# Altium footprint library Tienanh.PcbLib: 190 footprints (part 12 of 12)
Each footprint in its own frame and in the unit in brackets; x right, y up, seen from the top. Pads: shape width x height; smd on the part's side, far side on the other; paste and mask are expansions set on the pad; w line width, h text height; cw(c..) or ccw(c..) is an arc to the next point about the centre after c.
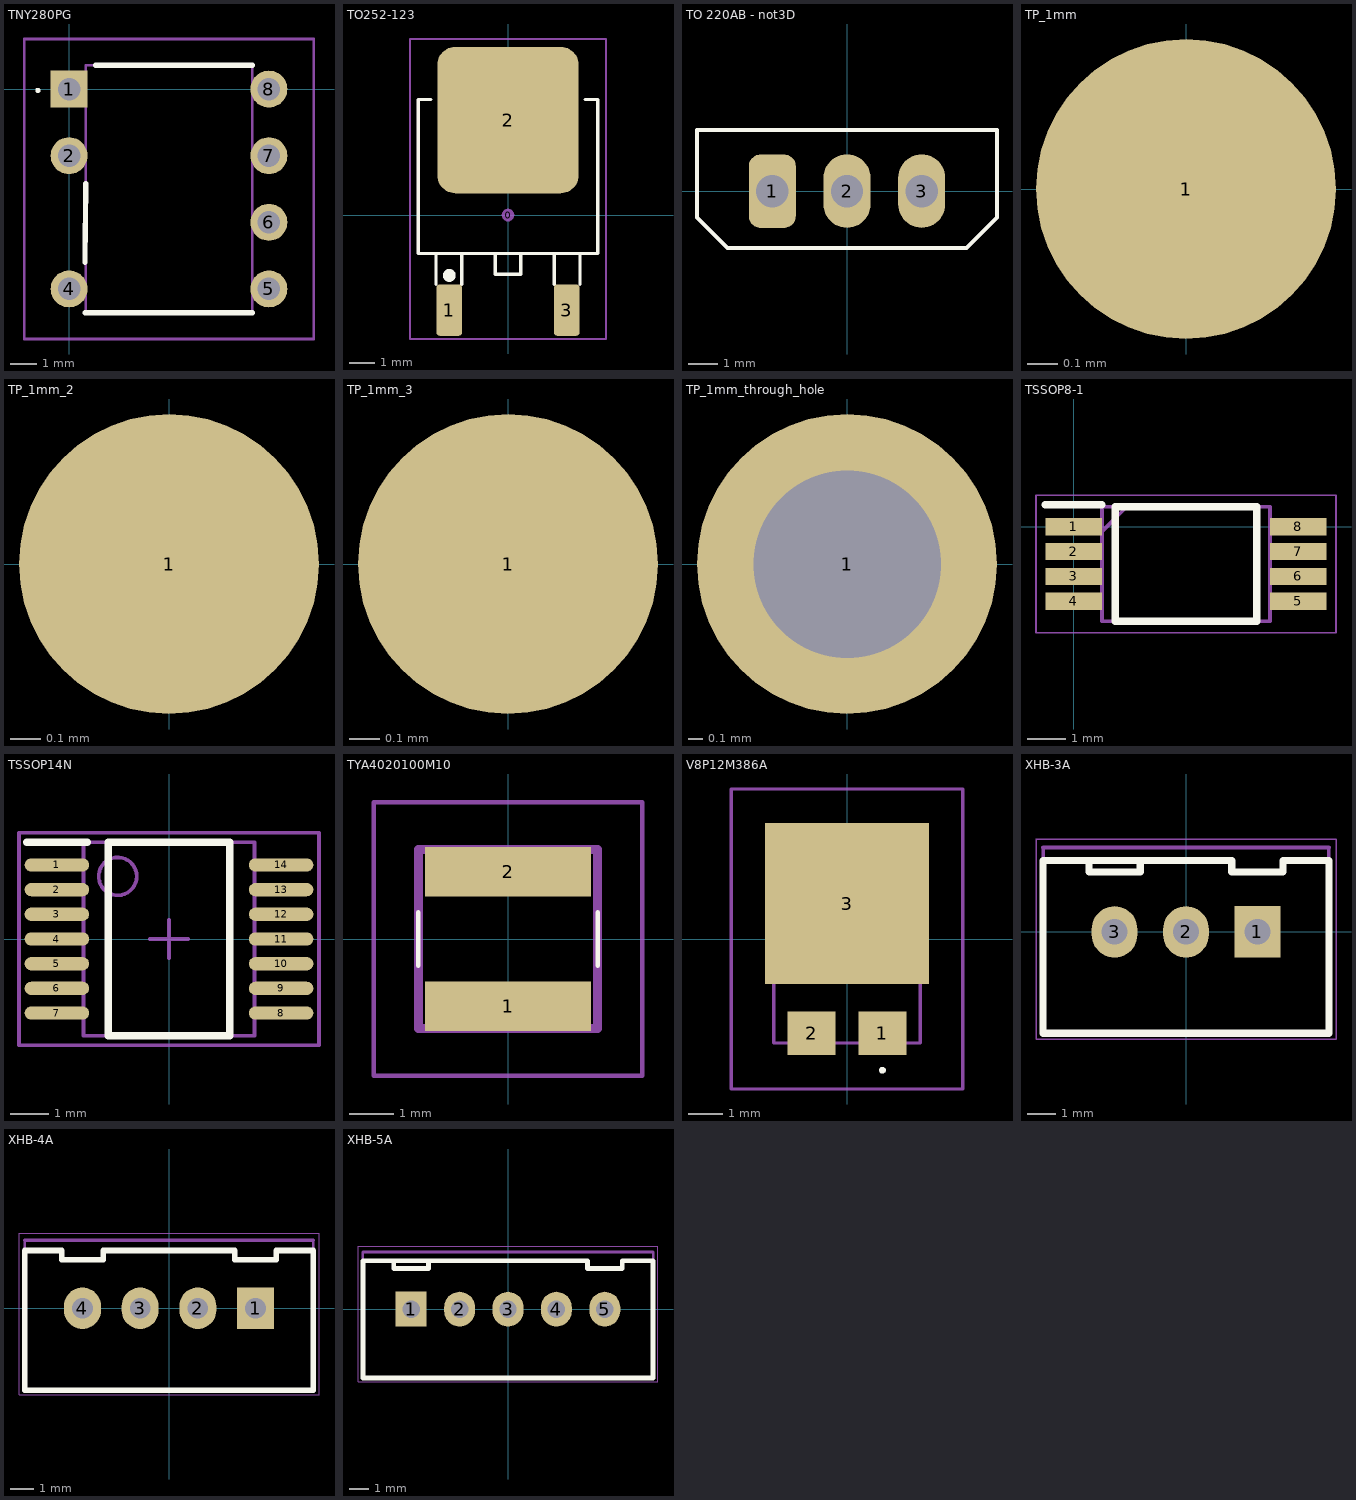
[diagram p11: the footprints below, top view; thin cyan lines are the x and y axes]

## TNY280PG [mm]
pads (7):
  rect 1.41x1.41 hole 0.86: 1(-0.01,0)
  round 1.41 hole 0.86: 2(-0.01,-2.54) 4(-0.01,-7.62) 5(7.61,-7.62) 6(7.61,-5.08) 7(7.61,-2.54) 8(7.61,0)
Top Overlay:
  lines w0.1: -1.2,-0.1 cw(c-1.2,-0.05) -1.2,0 cw(c-1.2,-0.05) -1.2,-0.1
  lines w0.2: 0.6,-8.53 6.975,-8.53 ; 0.6,-6.61 0.625,-3.61 ; 1,0.91 6.975,0.91
Mechanical 13:
  lines w0.1: 0.625,-8.53 6.975,-8.53 6.975,0.91 0.625,0.91 0.625,-8.53
Mechanical 15:
  lines w0.1: -1.715,-9.53 9.315,-9.53 9.315,1.91 -1.715,1.91 -1.715,-9.53
3D body "TNY280PG.stp": height 3.78, standoff -5, extent -0.337,-8.53 7.94,0.91

## TO252-123 [mm]
pads (4):
  round 0.5 on Mech15: 0(0,0)
  rrect25% 1x2 smd mask+0.07: 1(-2.285,-3.7) 3(2.285,-3.7)
  rrect25% 5.5x5.7 smd mask+0.07: 2(0,3.7)
Top Overlay:
  circle w0.25: c-2.285,-2.35 r0.125
  lines w0.127: -3,4.5 -3.5,4.5 -3.5,-1.5 3.5,-1.5 3.5,4.5 3,4.5 ; -2.8,-2.7 -2.8,-1.5 -1.8,-1.5 -1.8,-2.7 ; 1.8,-2.7 1.8,-1.5 2.8,-1.5 2.8,-2.7 ; -0.5,-2.3 0.5,-2.3 0.5,-1.5 -0.5,-1.5 -0.5,-2.3
Mechanical 15:
  lines w0.076: -3.81,-4.826 3.81,-4.826 3.81,6.858 -3.81,6.858 -3.81,-4.826
3D body "DPAK.stp": height 2.31, standoff 0, extent -3.3,-3.951 3.3,5.762

## TO 220AB - not3D [mm]
pads (3):
  rrect50% 1.6x2.5 hole 1.1: 1(-2.54,0)
  oval 1.6x2.5 hole 1.1: 2(0,0) 3(2.54,0)
Top Overlay:
  lines w0.127: -5.1,2.07 -5.1,-0.894 -4.064,-1.93 ; -5.1,2.075 5.1,2.075 ; -5.08,-0.914 -4.064,-1.93 ; 5.08,-0.914 4.064,-1.93 ; 5.1,2.07 5.1,-0.894 4.064,-1.93 ; -4.064,-1.93 4.064,-1.93

## TP_1mm [mm] "Surface"
pads (1):
  round 1 smd mask+0.07: 1(0,0)
3D body: height 0.2, standoff 0, extent -0.5,-0.5 0.5,0.5

## TP_1mm_2 [mm]
pads (1):
  round 1 smd mask+0.07: 1(0,0)
3D body: height 0.2, standoff 0, extent -0.5,-0.5 0.5,0.5

## TP_1mm_3 [mm]
pads (1):
  round 1 smd mask+0.07: 1(0,0)
3D body: height 0.2, standoff 0, extent -0.496,-0.499 0.5,0.499

## TP_1mm_through_hole [mil]
pads (1):
  round 80 hole 50: 1(0,0)
3D body "testpin red 1mm.stp": height 196.85, standoff -99.6, extent -45.28,-45.29 45.29,45.3

## TSSOP8-1 [mm]
pads (8):
  rect 1.475x0.45 smd: 1(0,0) 2(0,-0.65) 3(0,-1.3) 4(0,-1.95) 5(5.876,-1.95) 6(5.876,-1.3) 7(5.876,-0.65) 8(5.876,0)
Top Overlay:
  lines w0.2: -0.737,0.575 0.738,0.575 ; 1.088,-2.475 1.088,0.525 4.788,0.525 4.788,-2.475 1.088,-2.475
Mechanical 13:
  lines w0.1: 0.738,-0.125 1.388,0.525 ; 0.738,-2.475 0.738,0.525 5.138,0.525 5.138,-2.475 0.738,-2.475
Mechanical 15:
  lines w0.05: -0.987,-2.775 -0.987,0.825 6.863,0.825 6.863,-2.775 -0.987,-2.775
3D body "INA240A2PW.stp": height 1.11, standoff 0.01, extent -0.272,-2.475 6.148,0.525

## TSSOP14N [mm]
pads (14):
  oval 1.7x0.35 smd mask+0.07: 1(-2.952,1.95) 2(-2.952,1.3) 3(-2.952,0.65) 4(-2.952,0) 5(-2.952,-0.65) 6(-2.952,-1.3) 7(-2.952,-1.95) 8(2.952,-1.95) 9(2.952,-1.3) 10(2.952,-0.65) 11(2.952,0) 12(2.952,0.65) 13(2.952,1.3) 14(2.952,1.95)
Top Overlay:
  lines w0.2: -3.75,2.55 -2.15,2.55 ; -1.6,-2.55 1.6,-2.55 1.6,2.55 -1.6,2.55 -1.6,-2.55
Mechanical 13:
  circle w0.1: c-1.35,1.65 r0.5
  lines w0.1: -2.25,-2.55 2.25,-2.55 2.25,2.55 -2.25,2.55 -2.25,-2.55
Mechanical 15:
  lines w0.1: -0.5,0 0.5,0 ; 0,-0.5 0,0.5 ; -3.95,-2.8 3.95,-2.8 3.95,2.8 -3.95,2.8 -3.95,-2.8
3D body "PW14.stp": height 1.2, standoff 0, extent -3.302,-2.553 3.302,2.553

## TYA4020100M10 [mm]
pads (2):
  rect 3.7x1.1 smd: 1(0,-1.5) 2(0,1.5)
Top Overlay:
  lines w0.1: -2,-0.6 -2,0.6 ; 2,-0.6 2,0.6
Mechanical 13:
  lines w0.2: -2,-2 2,-2 2,2 -2,2 -2,-2
Mechanical 15:
  lines w0.1: -3,-3.05 3,-3.05 3,3.05 -3,3.05 -3,-3.05
3D body "TYA4020100M-10.stp": height 2.2, standoff 0, extent -2,-2 2,2

## V8P12M386A [mm]
pads (3):
  rect 1.4x1.27 smd: 1(1.04,-2.765) 2(-1.04,-2.765)
  rect 4.8x4.72 smd: 3(0,1.04)
Top Overlay:
  lines w0.1: 1.04,-3.9 cw(c1.04,-3.85) 1.04,-3.8 cw(c1.04,-3.85) 1.04,-3.9
Mechanical 13:
  lines w0.1: -2.15,-3.05 -2.15,3.05 2.15,3.05 2.15,-3.05 -2.15,-3.05
Mechanical 15:
  lines w0.1: -3.4,-4.4 -3.4,4.4 3.4,4.4 3.4,-4.4 -3.4,-4.4
3D body "V8P12-M3_86A.stp": height 1.3, standoff 0, extent -2.15,-3.273 2.15,3.05

## XHB-3A [mm]
pads (3):
  rect 1.6x1.8 hole 0.9: 1(2.5,0)
  oval 1.6x1.8 hole 0.9: 2(0,0) 3(-2.5,0)
Top Overlay:
  lines w0.25: -4.1,2.5 1.6,2.5 1.6,2.1 3.4,2.1 3.4,2.5 5,2.5 5,-3.55 -5,-3.55 -5,2.5 -3.4,2.5 -3.4,2.1 -1.6,2.1 -1.6,2.5
Mechanical 13:
  lines w0.127: -5,-3.55 -5,2.95 ; 5,-3.55 5,2.95
  lines w0.15: -5,-3.55 5,-3.55 ; -5,2.95 5,2.95
Mechanical 15:
  lines w0.05: 5.25,-3.75 5.25,3.25 -5.25,3.25 -5.25,-3.75 5.25,-3.75 ; 5.25,-3.75 5.25,-3.75
3D body "x8821wv-03l-n0sn.stp": height 7.2, standoff -3.4, extent -5,-3.554 5,2.95

## XHB-4A [mm]
pads (4):
  rect 1.6x1.8 hole 0.9: 1(3.75,0)
  oval 1.6x1.8 hole 0.9: 2(1.25,0) 3(-1.25,0) 4(-3.75,0)
Top Overlay:
  lines w0.25: -6.25,-3.55 6.25,-3.55 6.25,2.5 4.65,2.5 4.65,2.1 2.85,2.1 2.85,2.5 -2.85,2.5 -2.85,2.1 -4.65,2.1 -4.65,2.5 -6.25,2.5 -6.25,-3.55
Mechanical 13:
  lines w0.127: -6.25,-3.55 -6.25,2.95 ; 6.25,-3.55 6.25,2.95
  lines w0.15: -6.25,-3.55 6.25,-3.55 ; -6.25,2.95 6.25,2.95
Mechanical 15:
  lines w0.05: 6.5,-3.75 6.5,-3.75 ; 6.5,-3.75 -6.5,-3.75 -6.5,3.25 6.5,3.25 6.5,-3.75
3D body "X8821WV-04L-N0SN.stp": height 7.2, standoff -3.4, extent -6.25,-3.554 6.25,2.95

## XHB-5A [mm]
pads (5):
  rect 1.6x1.8 hole 0.9: 1(-5,0)
  oval 1.6x1.8 hole 0.9: 2(-2.5,0) 3(0,0) 4(2.5,0) 5(5,0)
Top Overlay:
  lines w0.25: -6.6,2.5 4.1,2.5 4.1,2.1 5.9,2.1 5.9,2.5 7.5,2.5 7.5,-3.55 -7.5,-3.55 -7.5,2.5 -5.9,2.5 -5.9,2.1 -4.1,2.1 -4.1,2.5
Mechanical 13:
  lines w0.127: -7.5,-3.55 -7.5,2.95 ; 7.5,-3.55 7.5,2.95
  lines w0.15: -7.5,-3.55 7.5,-3.55 ; -7.5,2.95 7.5,2.95
Mechanical 15:
  lines w0.05: 7.75,-3.75 7.75,3.25 -7.75,3.25 -7.75,-3.75 7.75,-3.75 ; 7.75,-3.75 7.75,-3.75
3D body "x8821wv-05l-n0sn.stp": height 2.8, standoff -7.8, extent -7.5,-3.55 7.5,2.954